# Altium footprint library Alhambra_II.PcbLib: 43 footprints (part 3 of 3)
Each footprint in its own frame and in the unit in brackets; x right, y up, seen from the top. Pads: shape width x height; smd on the part's side, far side on the other; paste and mask are expansions set on the pad; w line width, h text height; cw(c..) or ccw(c..) is an arc to the next point about the centre after c.
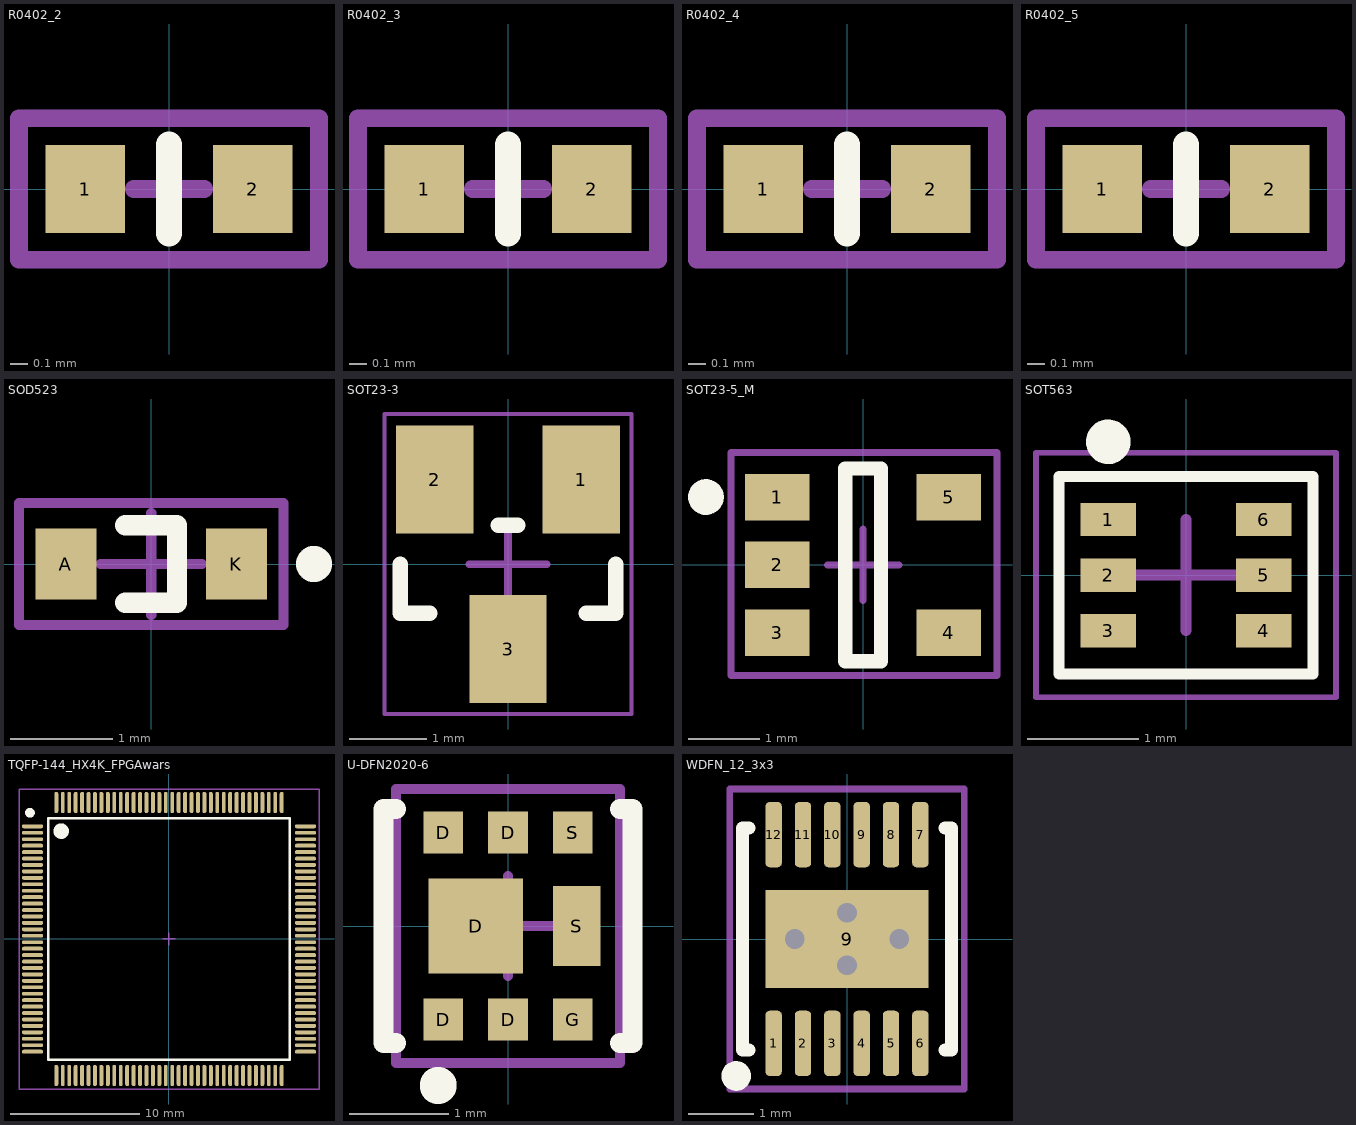
[diagram p2: the footprints below, top view; thin cyan lines are the x and y axes]

## R0402_2 [mm]
pads (2):
  rect 0.45x0.5 smd: 1(-0.475,0) 2(0.475,0)
Top Overlay:
  lines w0.15: 0,-0.25 0,0.25
Mechanical 15:
  lines w0.1: -0.2,0 0.2,0 ; 0,-0.2 0,0.2 ; -0.85,-0.4 0.85,-0.4 0.85,0.4 -0.85,0.4 -0.85,-0.4
3D body "R_0402.step": height 0.3, standoff 0, extent -0.5,-0.25 0.5,0.25

## R0402_3 [mm]
pads (2):
  rect 0.45x0.5 smd: 1(-0.475,0) 2(0.475,0)
Top Overlay:
  lines w0.15: 0,-0.25 0,0.25
Mechanical 15:
  lines w0.1: -0.2,0 0.2,0 ; 0,-0.2 0,0.2 ; -0.85,-0.4 -0.85,0.4 0.85,0.4 0.85,-0.4 -0.85,-0.4
3D body "R_0402.step": height 0.3, standoff 0, extent -0.5,-0.25 0.5,0.25

## R0402_4 [mm]
pads (2):
  rect 0.45x0.5 smd: 1(-0.475,0) 2(0.475,0)
Top Overlay:
  lines w0.15: 0,-0.25 0,0.25
Mechanical 15:
  lines w0.1: -0.2,0 0.2,0 ; 0,-0.2 0,0.2 ; -0.85,-0.4 -0.85,0.4 0.85,0.4 0.85,-0.4 -0.85,-0.4
3D body "R_0402.step": height 0.3, standoff 0, extent -0.5,-0.25 0.5,0.25

## R0402_5 [mm]
pads (2):
  rect 0.45x0.5 smd: 1(-0.475,0) 2(0.475,0)
Top Overlay:
  lines w0.15: 0,-0.25 0,0.25
Mechanical 15:
  lines w0.1: -0.2,0 0.2,0 ; 0,-0.2 0,0.2 ; -0.85,-0.4 -0.85,0.4 0.85,0.4 0.85,-0.4 -0.85,-0.4
3D body "R_0402.step": height 0.3, standoff 0, extent -0.5,-0.25 0.5,0.25

## SOD523 [mm] "Small outline diode, 1.6x0.8mm,"
height 1.15
pads (2):
  rect 0.6x0.7 smd: A(-0.838,0) K(0.838,0)
Top Overlay:
  circle w0.254: c1.6,0 r0.05
  lines w0.2: -0.254,-0.381 0.254,-0.381 0.254,0.381 -0.254,0.381
Mechanical 15:
  lines w0.1: -0.5,0 0.5,0 ; 0,-0.5 0,0.5 ; -1.3,-0.6 -1.3,0.6 1.3,0.6 1.3,-0.6 -1.3,-0.6
3D body "User Library-SOD523.step": height 0.71, standoff 0, extent -0.915,-0.424 0.915,0.424

## SOT23-3 [mm] "SOT23, 3-Leads, Body 2.9x1.3mm, Pitch 0.95mm, Lead Span 2.5mm, IPC High Density"
height 1.1
pads (3):
  rect 1x1.4 smd: 1(0.95,1.1) 2(-0.95,1.1) 3(0,-1.1)
Top Overlay:
  lines w0.2: -1.397,0 -1.397,-0.635 -1.016,-0.635 ; -0.127,0.508 0.127,0.508 ; 1.016,-0.635 1.397,-0.635 1.397,0
Mechanical 15:
  lines w0.05: -1.6,-1.94 -1.6,1.95 1.6,1.95 1.6,-1.94 -1.6,-1.94
  lines w0.1: -0.5,0 0.5,0 ; 0,-0.5 0,0.5
3D body "SOT233.STEP": height 1.07, standoff -0.03, extent -1.44,-1.45 1.46,1.35

## SOT23-5_M [mm] "SOT23-5 Medium density"
height 1
pads (5):
  rect 0.9x0.65 smd: 1(-1.2,0.95) 2(-1.2,0) 3(-1.2,-0.95) 4(1.2,-0.95) 5(1.2,0.95)
Top Overlay:
  circle w0.25: c-2.2,0.95 r0.125
  lines w0.2: -0.25,-1.35 0.25,-1.35 0.25,1.35 -0.25,1.35 -0.25,-1.35
Mechanical 15:
  lines w0.1: -0.5,0 0.5,0 ; 0,-0.5 0,0.5 ; -1.85,-1.55 -1.85,1.575 1.875,1.575 1.875,-1.55 -1.85,-1.55
3D body "User Library-sot235.step": height 1, standoff 0, extent -1.17,-1.46 1.17,1.46

## SOT563 [mm] "SOT563, 6-Leads, Body 1,60x1,20mm, Pitch 0,50mm, IPC Medium Density"
height 0.6
pads (6):
  rect 0.5x0.3 smd paste+0 mask+0.05: 1(-0.7,0.5) 2(-0.7,0) 3(-0.7,-0.5) 4(0.7,-0.5) 5(0.7,0) 6(0.7,0.5)
Top Overlay:
  circle w0.2: c-0.7,1.2 r0.1
  lines w0.1: -1.143,-0.889 -1.143,0.889 1.143,0.889 1.143,-0.889 -1.143,-0.889
Mechanical 15:
  lines w0.05: -1.35,-1.1 -1.35,1.1 1.35,1.1 1.35,-1.1 -1.35,-1.1
  lines w0.1: -0.5,0 0.5,0 ; 0,-0.5 0,0.5
3D body "WE-TVS_High_Speed_SOT563.stp": height 0.55, standoff 0, extent -0.8,-0.8 0.8,0.8

## TQFP-144_HX4K_FPGAwars [mm] "QFP, 144-Leads, Body 20x20mm, Pitch 0.5mm, Lattice HX4K"
height 1.6
pads (144):
  oval 1.65x0.3 smd: 1(-10.6,8.75) 2(-10.6,8.25) 3(-10.6,7.75) 4(-10.6,7.25) 5(-10.6,6.75) 6(-10.6,6.25) 7(-10.6,5.75) 8(-10.6,5.25) 9(-10.6,4.75) 10(-10.6,4.25) 11(-10.6,3.75) 12(-10.6,3.25) 13(-10.6,2.75) 14(-10.6,2.25) 15(-10.6,1.75) 16(-10.6,1.25) 17(-10.6,0.75) 18(-10.6,0.25) 19(-10.6,-0.25) 20(-10.6,-0.75) 21(-10.6,-1.25) 22(-10.6,-1.75) 23(-10.6,-2.25) 24(-10.6,-2.75) 25(-10.6,-3.25) 26(-10.6,-3.75) 27(-10.6,-4.25) 28(-10.6,-4.75) 29(-10.6,-5.25) 30(-10.6,-5.75) 31(-10.6,-6.25) 32(-10.6,-6.75) 33(-10.6,-7.25) 34(-10.6,-7.75) 35(-10.6,-8.25) 36(-10.6,-8.75) 73(10.6,-8.75) 74(10.6,-8.25) 75(10.6,-7.75) 76(10.6,-7.25) 77(10.6,-6.75) 78(10.6,-6.25) 79(10.6,-5.75) 80(10.6,-5.25) 81(10.6,-4.75) 82(10.6,-4.25) 83(10.6,-3.75) 84(10.6,-3.25) 85(10.6,-2.75) 86(10.6,-2.25) 87(10.6,-1.75) 88(10.6,-1.25) 89(10.6,-0.75) 90(10.6,-0.25) 91(10.6,0.25) 92(10.6,0.75) 93(10.6,1.25) 94(10.6,1.75) 95(10.6,2.25) 96(10.6,2.75) 97(10.6,3.25) 98(10.6,3.75) 99(10.6,4.25) 100(10.6,4.75) 101(10.6,5.25) 102(10.6,5.75) 103(10.6,6.25) 104(10.6,6.75) 105(10.6,7.25) 106(10.6,7.75) 107(10.6,8.25) 108(10.6,8.75)
  oval 0.3x1.65 smd: 37(-8.75,-10.6) 38(-8.25,-10.6) 39(-7.75,-10.6) 40(-7.25,-10.6) 41(-6.75,-10.6) 42(-6.25,-10.6) 43(-5.75,-10.6) 44(-5.25,-10.6) 45(-4.75,-10.6) 46(-4.25,-10.6) 47(-3.75,-10.6) 48(-3.25,-10.6) 49(-2.75,-10.6) 50(-2.25,-10.6) 51(-1.75,-10.6) 52(-1.25,-10.6) 53(-0.75,-10.6) 54(-0.25,-10.6) 55(0.25,-10.6) 56(0.75,-10.6) 57(1.25,-10.6) 58(1.75,-10.6) 59(2.25,-10.6) 60(2.75,-10.6) 61(3.25,-10.6) 62(3.75,-10.6) 63(4.25,-10.6) 64(4.75,-10.6) 65(5.25,-10.6) 66(5.75,-10.6) 67(6.25,-10.6) 68(6.75,-10.6) 69(7.25,-10.6) 70(7.75,-10.6) 71(8.25,-10.6) 72(8.75,-10.6) 109(8.75,10.6) 110(8.25,10.6) 111(7.75,10.6) 112(7.25,10.6) 113(6.75,10.6) 114(6.25,10.6) 115(5.75,10.6) 116(5.25,10.6) 117(4.75,10.6) 118(4.25,10.6) 119(3.75,10.6) 120(3.25,10.6) 121(2.75,10.6) 122(2.25,10.6) 123(1.75,10.6) 124(1.25,10.6) 125(0.75,10.6) 126(0.25,10.6) 127(-0.25,10.6) 128(-0.75,10.6) 129(-1.25,10.6) 130(-1.75,10.6) 131(-2.25,10.6) 132(-2.75,10.6) 133(-3.25,10.6) 134(-3.75,10.6) 135(-4.25,10.6) 136(-4.75,10.6) 137(-5.25,10.6) 138(-5.75,10.6) 139(-6.25,10.6) 140(-6.75,10.6) 141(-7.25,10.6) 142(-7.75,10.6) 143(-8.25,10.6) 144(-8.75,10.6)
Top Overlay:
  circle w0.6: c-8.375,8.375 r0.3
  circle w0.5: c-10.8,9.8 r0.125
  lines w0.2: -9.375,-9.375 9.375,-9.375 9.375,9.375 -9.375,9.375 -9.375,-9.375
Mechanical 15:
  lines w0.1: -0.5,0 0.5,0 ; 0,-0.5 0,0.5 ; -11.65,-11.65 11.65,-11.65 11.65,11.65 -11.65,11.65 -11.65,-11.65
3D body "TQFP-144-iCE40-FPGAwars-Lattice2.step": height 1.15, standoff 0, extent -11.009,-11.009 11.009,11.009

## U-DFN2020-6 [mm] "U-DFN, 2.0x2.0mm, 6 pin, 0.65mm Pitch"
height 0.63
pads (8):
  rect 0.4x0.425 smd: D(-0.65,-0.938) D(-0.65,0.938) D(0,-0.938) D(0,0.938) G(0.65,-0.938) S(0.65,0.938)
  rect 0.95x0.95 smd: D(-0.325,0)
  rect 0.48x0.8 smd: S(0.69,0)
Top Overlay:
  circle w0.3: c-0.7,-1.6 r0.035
  lines w0.2: -1.125,-1.175 -1.25,-1.175 -1.25,1.175 -1.125,1.175 ; 1.125,-1.175 1.25,-1.175 1.25,1.175 1.125,1.175
Mechanical 15:
  lines w0.1: -0.5,0 0.5,0 ; 0,-0.5 0,0.5 ; -1.125,-1.375 1.125,-1.375 1.125,1.375 -1.125,1.375 -1.125,-1.375
3D body "DFN2020-6.STEP": height 0.65, standoff 0, extent -1,-1 1,1

## WDFN_12_3x3 [mm] "WDFN-12 3x3mm"
height 0.75
pads (13):
  rrect50% 0.25x1 smd: 1(-1.125,-1.6) 2(-0.675,-1.6) 3(-0.225,-1.6) 4(0.225,-1.6) 5(0.675,-1.6) 6(1.125,-1.6) 7(1.125,1.6) 8(0.675,1.6) 9(0.225,1.6) 10(-0.225,1.6) 11(-0.675,1.6) 12(-1.125,1.6)
  rect 2.5x1.5 smd paste-2: 9(0,0)
via 0.8,0 diameter 0.7 hole 0.3
via -0.8,0 diameter 0.7 hole 0.3
via 0,-0.4 diameter 0.7 hole 0.3
via 0,0.4 diameter 0.7 hole 0.3
Top Overlay:
  circle w0.254: c-1.7,-2.1 r0.1
  lines w0.2: -1.5,-1.7 -1.6,-1.7 -1.6,1.7 -1.5,1.7 ; 1.5,-1.7 1.6,-1.7 1.6,1.7 1.5,1.7
Top Paste:
  rectangle: -1.2,0.2 -0.2,0.7
  region: 1.2,-0.2 0.2,-0.2 0.2,-0.7 1.2,-0.7
  rectangle: -1.2,-0.7 -0.2,-0.2
  region: 1.2,0.7 0.2,0.7 0.2,0.2 1.2,0.2
Mechanical 15:
  lines w0.1: -0.5,0 0.5,0 ; 0,-0.5 0,0.5 ; -1.8,-2.3 1.8,-2.3 1.8,2.3 -1.8,2.3 -1.8,-2.3
3D body "User Library-DFN12(3x3)-1.step": height 0.76, standoff 0, extent -1.5,-1.501 1.5,1.501